# Altium footprint library my Library.PcbLib: 1247 footprints (part 34 of 78)
Each footprint in its own frame and in the unit in brackets; x right, y up, seen from the top. Pads: shape width x height; smd on the part's side, far side on the other; paste and mask are expansions set on the pad; w line width, h text height; cw(c..) or ccw(c..) is an arc to the next point about the centre after c.
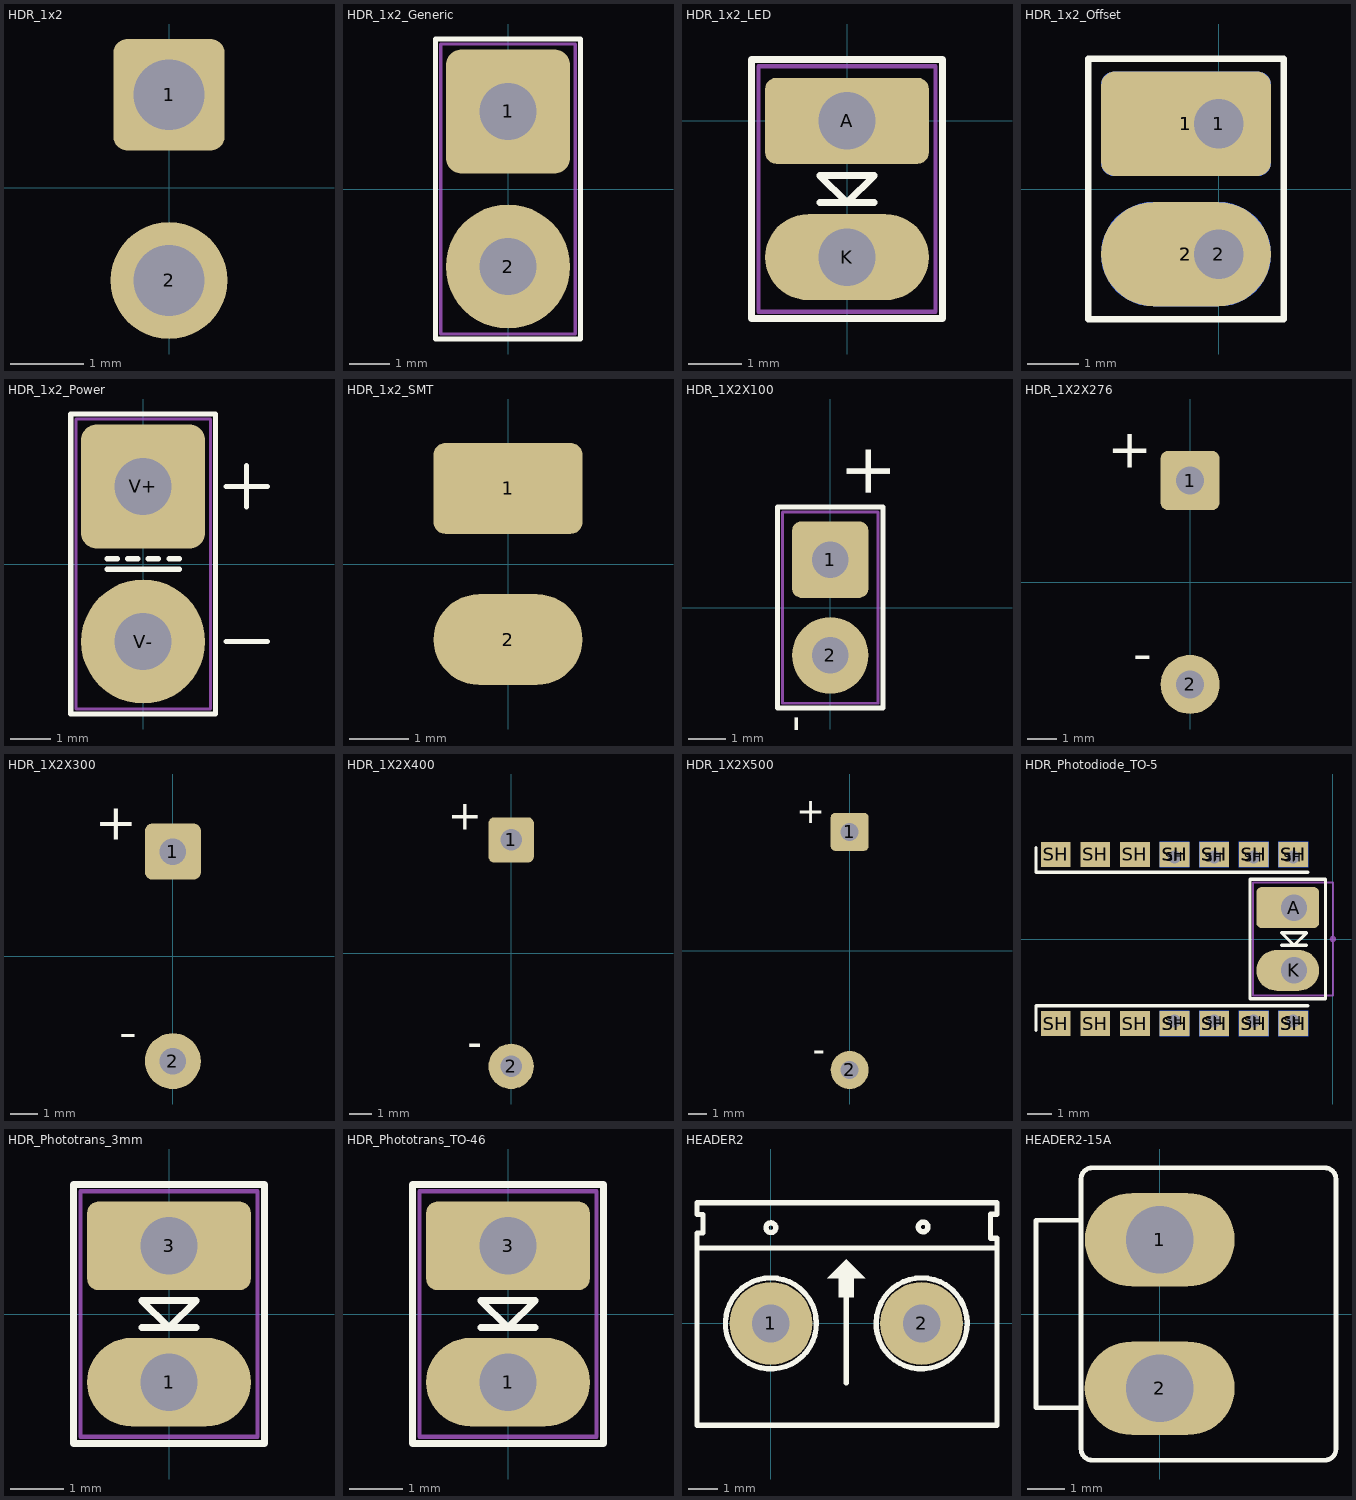
[diagram p33: the footprints below, top view; thin cyan lines are the x and y axes]

## HDR_1x2 [mil]
pads (2):
  rrect25% 60x60 hole 38: 1(0,50)
  round 62.99 hole 38: 2(0,-50)
3D body: height -3, standoff -5, extent -19.84,-19.96 20,19.96

## HDR_1x2_Generic [mil] "Connector Header, Single-row 2-position, 0.200\" pitch"
height 235
pads (2):
  rrect25% 120x120 hole 55: 1(0,75)
  round 120 hole 55: 2(0,-75)
Top Overlay:
  lines w5: -70,-145 -70,145 70,145 70,-145 -70,-145
Mechanical 13:
  lines w3: -65,-140 -65,140 65,140 65,-140 -65,-140

## HDR_1x2_LED [mil] "Connector Header, Single-row 2-position, 0.100\" pitch"
height 235
pads (2):
  rrect25% 120x63 hole 42: A(0,0)
  oval 120x63 hole 42: K(0,-100)
Top Overlay:
  lines w5: -20,-60 20,-60 ; -70,-145 -70,45 70,45 70,-145 -70,-145 ; -20,-40 20,-40 0,-60 -20,-40
Mechanical 13:
  lines w3: -65,-140 -65,40 65,40 65,-140 -65,-140

## HDR_1x2_Offset [mil]
pads (6):
  rrect25% 130x80 smd far side: 1(-25,50)
  rrect25% 130x80 smd: 1(-25,50)
  rrect25% 60x60 hole 38: 1(0,50)
  oval 130x80 smd far side: 2(-25,-50)
  oval 130x80 smd: 2(-25,-50)
  round 60 hole 38: 2(0,-50)
Top Overlay:
  lines w5: -100,-100 50,-100 50,100 -100,100 -100,-100

## HDR_1x2_Power [mil] "Connector Header, Single-row 2-position, 0.200\" pitch"
height 235
pads (2):
  rrect25% 120x120 hole 55: V+(0,75)
  round 120 hole 55: V-(0,-75)
Top Overlay:
  lines w5: -35,-5 35,-5 ; -35,5 -25,5 ; -15,5 -5,5 ; 5,5 15,5 ; 25,5 35,5 ; 80,-75 120,-75 ; 80,75 120,75 ; 100,55 100,95 ; -70,-145 -70,145 70,145 70,-145 -70,-145
Mechanical 13:
  lines w3: -65,-140 -65,140 65,140 65,-140 -65,-140

## HDR_1x2_SMT [mm]
pads (2):
  rrect25% 2.5x1.524 smd: 1(0,1.27)
  oval 2.5x1.524 smd: 2(0,-1.27)

## HDR_1X2X100 [mil]
pads (2):
  rrect25% 80x80 hole 38: 1(0,50)
  round 80 hole 38: 2(0,-50)
Top Overlay:
  lines w5: -55,-105 -55,105 55,105 55,-105 -55,-105
  text "+" at 0,112.2 h90
  text "-" at 0,-111.22 h90
Mechanical 13:
  lines w3: -50,-100 -50,100 50,100 50,-100 -50,-100
3D body: height -3, standoff -5, extent -19.84,-19.96 20,19.96

## HDR_1X2X276 [mil]
pads (2):
  rrect25% 80x80 hole 38: 1(0,137.8)
  round 80 hole 38: 2(0,-137.8)
Top Overlay:
  text "-" at -51.18,-137.8 h90
  text "+" at -51.18,137.8 h90
Bottom Overlay:
  text "+" at -51.18,137.8 h90
  text "-" at -51.18,-137.8 h90
3D body: height -3, standoff -5, extent -19.84,-157.75 20,-117.83
3D body: height -3, standoff -5, extent -19.84,117.84 20,157.76

## HDR_1X2X300 [mil]
pads (2):
  rrect25% 80x80 hole 38: 1(0,150)
  round 80 hole 38: 2(0,-150)
Top Overlay:
  text "-" at -51.18,-149.61 h90
  text "+" at -51.18,149.61 h90
3D body: height -3, standoff -5, extent -19.84,130.04 20,169.96
3D body: height -3, standoff -5, extent -19.84,-169.96 20,-130.04

## HDR_1X2X400 [mil]
pads (2):
  rrect25% 80x80 hole 38: 1(0,200)
  round 80 hole 38: 2(0,-200)
Top Overlay:
  text "-" at -51.18,-200 h90
  text "+" at -51.18,200 h90
3D body: height -3, standoff -5, extent -19.84,180.04 20,219.96
3D body: height -3, standoff -5, extent -19.84,-219.96 20,-180.04

## HDR_1X2X500 [mil]
pads (2):
  rrect25% 80x80 hole 38: 1(0,250)
  round 80 hole 38: 2(0,-250)
Top Overlay:
  text "+" at -51.18,250 h90
  text "-" at -51.18,-250 h90
3D body: height 1.97, standoff 0, extent -40,210 40,290
3D body: height 1.97, standoff 0, extent -39.68,-289.91 40.01,-210.07

## HDR_Photodiode_TO-5 [mil] "Photodiode TO-5 form, edge straddling"
height 525
pads (33):
  round 10 on Mech15: 0(0,0)
  rrect25% 100x65 hole 42 copper offset -10,0: A(-61.81,50)
  oval 100x65 hole 42 copper offset -10,0: K(-61.81,-50)
  rect 47.24x40 smd: SH(-440.94,-134.49) SH(-440.94,134.5) SH(-377.95,-134.5) SH(-377.95,134.49) SH(-314.96,-134.5) SH(-314.96,134.49) SH(-251.97,-134.49) SH(-251.97,134.51) SH(-188.98,-134.49) SH(-188.98,134.5) SH(-125.99,-134.49) SH(-125.99,134.5) SH(-63,-134.49) SH(-63,134.5)
  rect 47.24x40 smd far side: SH(-251.97,-134.49) SH(-251.97,134.51) SH(-188.98,-134.49) SH(-188.98,134.5) SH(-125.99,-134.49) SH(-125.99,134.5) SH(-63,-134.49) SH(-63,134.5)
  round 32 hole 20: SH(-251.97,-130.49) SH(-251.97,130.51) SH(-188.98,-130.49) SH(-188.98,130.5) SH(-125.99,-130.49) SH(-125.99,130.5) SH(-63,-130.49) SH(-63,130.5)
Top Overlay:
  lines w5: -472.44,-145.66 -472.44,-106.29 -39.37,-106.29 ; -472.44,145.67 -472.44,106.3 -39.37,106.3 ; -81.81,-10 -41.81,-10 ; -131.81,-95 -11.81,-95 -11.81,95 -131.81,95 -131.81,-95 ; -81.81,10 -61.81,-10 -41.81,10 -81.81,10
Mechanical 13:
  lines w3: -126.81,-90 0,-90 0,90 -126.81,90 -126.81,-90
3D body "TO-5 custom with shield.stp": height 109.1, standoff -172.1, extent -444.88,-140.32 86.62,140.32

## HDR_Phototrans_3mm [mil] "LED 3mm dia lens, 0.100\" pitch"
height 525
pads (2):
  oval 120x65 hole 42: 1(0,-50)
  rrect25% 120x65 hole 42: 3(0,50)
Top Overlay:
  lines w5: -20,-10 20,-10 ; -70,-95 -70,95 70,95 70,-95 -70,-95 ; -20,10 20,10 0,-10 -20,10
Mechanical 13:
  lines w3: -65,-90 -65,90 65,90 65,-90 -65,-90
3D body "LED_3mm_T1.stp": height 290.55, standoff -475.2, extent -62.8,-60.99 63,64.99

## HDR_Phototrans_TO-46 [mil] "LED TO-46 form, edge straddling"
height 525
pads (2):
  oval 120x65 hole 42: 1(0,-50)
  rrect25% 120x65 hole 42: 3(0,50)
Top Overlay:
  lines w5: -20,-10 20,-10 ; -70,-95 70,-95 70,95 -70,95 -70,-95 ; -20,10 0,-10 20,10 -20,10
Mechanical 13:
  lines w3: -65,-90 65,-90 65,90 -65,90 -65,-90
3D body "TO-46 Edge straddling.stp": height 77.29, standoff -150.51, extent -8.99,-119.01 546.86,108.79

## HEADER2 [mil] "Header 2, 2 pin, hight 300mil, Pin to Pin 200, Colour Green"
height 300
pads (2):
  round 110 hole 50: 1(0,0) 2(200,0)
Top Overlay:
  circle w7: c0,127 r6.4
  circle w7: c202,128 r6.4
  region: 100,85 75,60 90,60 90,35 110,35 110,60 125,60
  lines w7: 38.83,46.23 ccw(c0,0) 40.11,45.12 ; 100,-79 100,72 ; 238.74,46.3 ccw(c200,0) 240.11,45.12 ; 299,100 -98,100 ; -98,100 -98,-135 300,-135 300,113 291.5,113 291.5,145 300,145 300,160 -95.5,160 -98,160 -98,144.5 -90,144.5 -90,120 -98,120 -98,100
3D body "SW3dPS-KRM2.STEP": height 393.7, standoff -157.48, extent -96.85,-135.28 296.85,160

## HEADER2-15A [mm]
pads (2):
  oval 4x2.5 hole 1.8: 1(0,1.98) 2(0,-1.98)
Top Overlay:
  lines w0.127: -2.1,-2.5 -3.3,-2.5 -3.3,2.5 -2.1,2.5 ; -0.5,-2.5 -0.3,-2.3 ; -0.5,-2.5 -0.5,-1.5 ; -0.5,-2.5 0.5,-2.5 ; -0.5,-1.5 0.5,-1.5 ; -0.5,-1.5 -0.3,-1.7 ; -0.5,1.5 0.5,1.5 ; -0.5,1.5 -0.3,1.7 ; -0.5,1.5 -0.5,2.5 ; -0.5,2.5 0.5,2.5 ; -0.5,2.5 -0.3,2.3 ; -0.3,-2.3 0.3,-2.3 ; -0.3,-2.3 -0.3,-1.7 ; -0.3,-1.7 0.3,-1.7 ; -0.3,1.7 0.3,1.7 ; -0.3,1.7 -0.3,2.3 ; -0.3,2.3 0.3,2.3 ; 0.3,-2.3 0.3,-1.7 ; 0.3,-2.3 0.5,-2.5 ; 0.3,-1.7 0.5,-1.5 ; 0.3,1.7 0.3,2.3 ; 0.3,1.7 0.5,1.5 ; 0.3,2.3 0.5,2.5 ; 0.5,-2.5 0.5,-1.5 ; 0.5,1.5 0.5,2.5 ; -2.1,-3.6 ccw(c-1.8,-3.6) -1.8,-3.9 4.4,-3.9 ccw(c4.4,-3.6) 4.7,-3.6 4.7,3.6 ccw(c4.4,3.6) 4.4,3.9 -1.8,3.9 ccw(c-1.8,3.6) -2.1,3.6 -2.1,-3.6
3D body "HEADER2-15A.STEP": height 11.25, standoff -3.55, extent -3.8,-3.9 4.7,3.9